# Altium footprint library lib_protel_HC.PCBLIB: 724 footprints (part 25 of 46)
Each footprint in its own frame and in the unit in brackets; x right, y up, seen from the top. Pads: shape width x height; smd on the part's side, far side on the other; paste and mask are expansions set on the pad; w line width, h text height; cw(c..) or ccw(c..) is an arc to the next point about the centre after c.
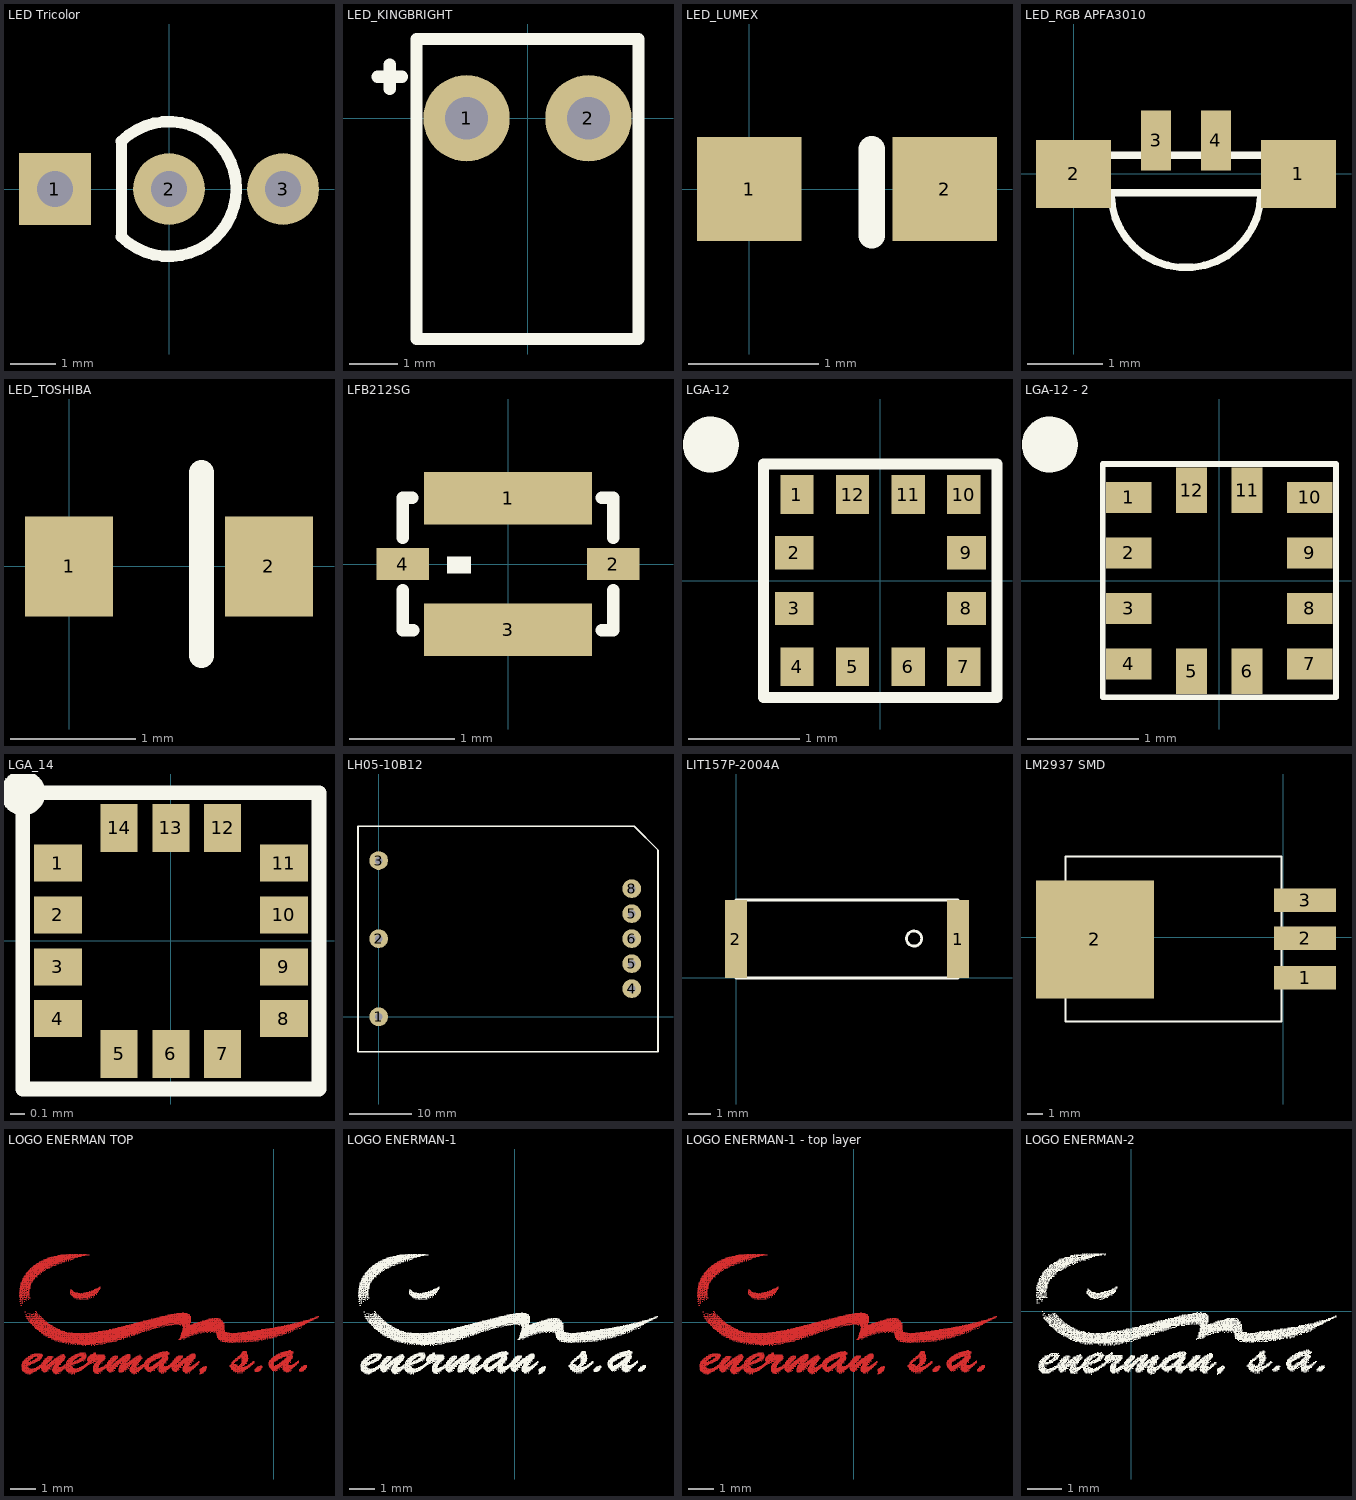
[diagram p24: the footprints below, top view; thin cyan lines are the x and y axes]

## LED Tricolor [mm]
pads (3):
  rect 1.6x1.6 hole 0.8: 1(-2.54,0)
  round 1.6 hole 0.8: 2(0,0) 3(2.54,0)
Top Overlay:
  lines w0.25: -1.061,-1.061 -1.061,1.061
  lines w0.254: -1.061,-1.061 ccw(c0,0) -1.061,1.061

## LED_KINGBRIGHT [mm]
pads (2):
  round 1.8 hole 0.889: 1(-1.27,0) 2(1.27,0)
Top Overlay:
  lines w0.254: -3.124,0.864 -2.616,0.864 ; -2.87,0.61 -2.87,1.118 ; -2.311,-4.597 -2.311,1.651 2.311,1.651 2.311,-4.597 -2.311,-4.597

## LED_LUMEX [mm]
pads (2):
  rect 0.8x0.8 smd: 1(0,0) 2(1.5,0)
Top Overlay:
  lines w0.2: 0.94,-0.356 0.94,0.305

## LED_RGB APFA3010 [mm] "LED RGB ANGULO RECTO"
height 1
pads (4):
  rect 1x0.9 smd: 1(3,0) 2(0,0)
  rect 0.4x0.8 smd: 3(1.1,0.45) 4(1.9,0.45)
Top Overlay:
  lines w0.1: 0.5,-0.25 ccw(c1.5,-0.25) 2.5,-0.25 ; 0,-0.25 3,-0.25 3,0.25 0,0.25 0,-0.25

## LED_TOSHIBA [mm]
pads (2):
  rect 0.7x0.8 smd: 1(0,0) 2(1.6,0)
Top Overlay:
  lines w0.2: 1.06,-0.71 1.06,0.75

## LFB212SG [mm] "CRYSTAL 2.45GHZ"
height 1
pads (4):
  rect 1.6x0.5 smd: 1(0,0.625) 3(0,-0.625)
  rect 0.5x0.3 smd: 2(1,0) 4(-1,0)
Top Overlay:
  rectangle: -0.58,-0.09 -0.35,0.07
  lines w0.12: -1,-0.25 -1,-0.63 -0.9,-0.63 ; -1,0.25 -1,0.63 -0.91,0.63 ; 0.89,-0.63 1,-0.63 1,-0.25 ; 0.89,0.63 1,0.63 1,0.25
3D body "User Library-X2Y_0805_(X15).STEP": height 1.02, standoff 0, extent -1,-0.647 1.032,0.625

## LGA-12 [mm]
height 0.95
pads (12):
  rect 0.3x0.35 smd mask+0.05: 1(-0.75,0.775) 4(-0.75,-0.775) 5(-0.25,-0.775) 6(0.25,-0.775) 7(0.75,-0.775) 10(0.75,0.775) 11(0.25,0.775) 12(-0.25,0.775)
  rect 0.35x0.3 smd mask+0.05: 2(-0.775,0.25) 3(-0.775,-0.25) 8(0.775,-0.25) 9(0.775,0.25)
Top Overlay:
  circle w0.254: c-1.525,1.225 r0.125
  lines w0.1: -1.05,-1.05 -1.05,1.05 1.05,1.05 1.05,-1.05 -1.05,-1.05
3D body: height 0.95, standoff 0, extent -1,-1 1,1

## LGA-12 - 2 [mm]
height 0.95
pads (12):
  rect 0.41x0.28 smd mask+0.05: 1(-0.815,0.75) 2(-0.815,0.25) 3(-0.815,-0.25) 4(-0.815,-0.75) 7(0.815,-0.75) 8(0.815,-0.25) 9(0.815,0.25) 10(0.815,0.75)
  rect 0.28x0.41 smd mask+0.05: 5(-0.25,-0.815) 6(0.25,-0.815) 11(0.25,0.815) 12(-0.25,0.815)
Top Overlay:
  circle w0.254: c-1.525,1.225 r0.125
  lines w0.05: -1.05,-1.05 -1.05,1.05 1.05,1.05 1.05,-1.05 -1.05,-1.05
3D body: height 0.95, standoff 0, extent -1,-1 1,1

## LGA_14 [mm] "LGA_14_2X2X1"
height 1
pads (14):
  rect 0.325x0.25 smd: 1(-0.763,0.525) 2(-0.763,0.175) 3(-0.763,-0.175) 4(-0.763,-0.525) 8(0.763,-0.525) 9(0.763,-0.175) 10(0.763,0.175) 11(0.763,0.525)
  rect 0.25x0.325 smd: 5(-0.35,-0.763) 6(0,-0.763) 7(0.35,-0.763) 12(0.35,0.763) 13(0,0.763) 14(-0.35,0.763)
Top Overlay:
  circle w0.254: c-1,1 r0.025
  lines w0.1: -1,-1 -1,1 1,1 1,-1 -1,-1
3D body: height 1, standoff 0, extent -1,-1 1,1

## LH05-10B12 [mm] "CONVERSOR AC/DC 12V"
height 21
pads (8):
  round 3 hole 1.2: 1(0,0) 2(0,12.5) 3(0,25) 4(40.5,4.5) 5(40.5,8.5) 5(40.5,16.5) 6(40.5,12.5) 8(40.5,20.5)
Top Overlay:
  lines w0.254: 39.116,30.48 40.894,30.48 ; 40.894,30.48 -3.302,30.48 -3.302,-5.588 44.704,-5.588 44.704,26.67 40.894,30.48

## LIT157P-2004A [mm]
pads (2):
  rect 1x3.5 smd: 1(9.992,1.75) 2(-0.008,1.75)
Top Overlay:
  circle w0.127: c8.012,1.77 r0.34
  lines w0.127: -0.008,0 9.992,0 9.992,3.5 -0.008,3.5 -0.008,0

## LM2937 SMD [mil] "PACK SOT-223"
pads (4):
  rect 157.48x60 smd: 1(55.24,-102.58) 2(55.24,-2.58) 3(55.24,94.58)
  rect 300x300 smd: 2(-480,-5)
Top Overlay:
  lines w5: -555,-214 -5,-214 -5,206 -555,206 -555,-214

## LOGO ENERMAN TOP [mm]
Top Layer:
  drawing of 3325 lines, arcs and shapes, not listed

## LOGO ENERMAN-1 [mm]
Top Overlay:
  drawing of 3325 lines, arcs and shapes, not listed

## LOGO ENERMAN-1 - top layer [mm]
Top Layer:
  drawing of 3325 lines, arcs and shapes, not listed

## LOGO ENERMAN-2 [mm]
Top Overlay:
  drawing of 2147 lines, arcs and shapes, not listed